# Altium footprint library 电解电容.PcbLib: 14 footprints
Each footprint in its own frame and in the unit in brackets; x right, y up, seen from the top. Pads: shape width x height; smd on the part's side, far side on the other; paste and mask are expansions set on the pad; w line width, h text height; cw(c..) or ccw(c..) is an arc to the next point about the centre after c.
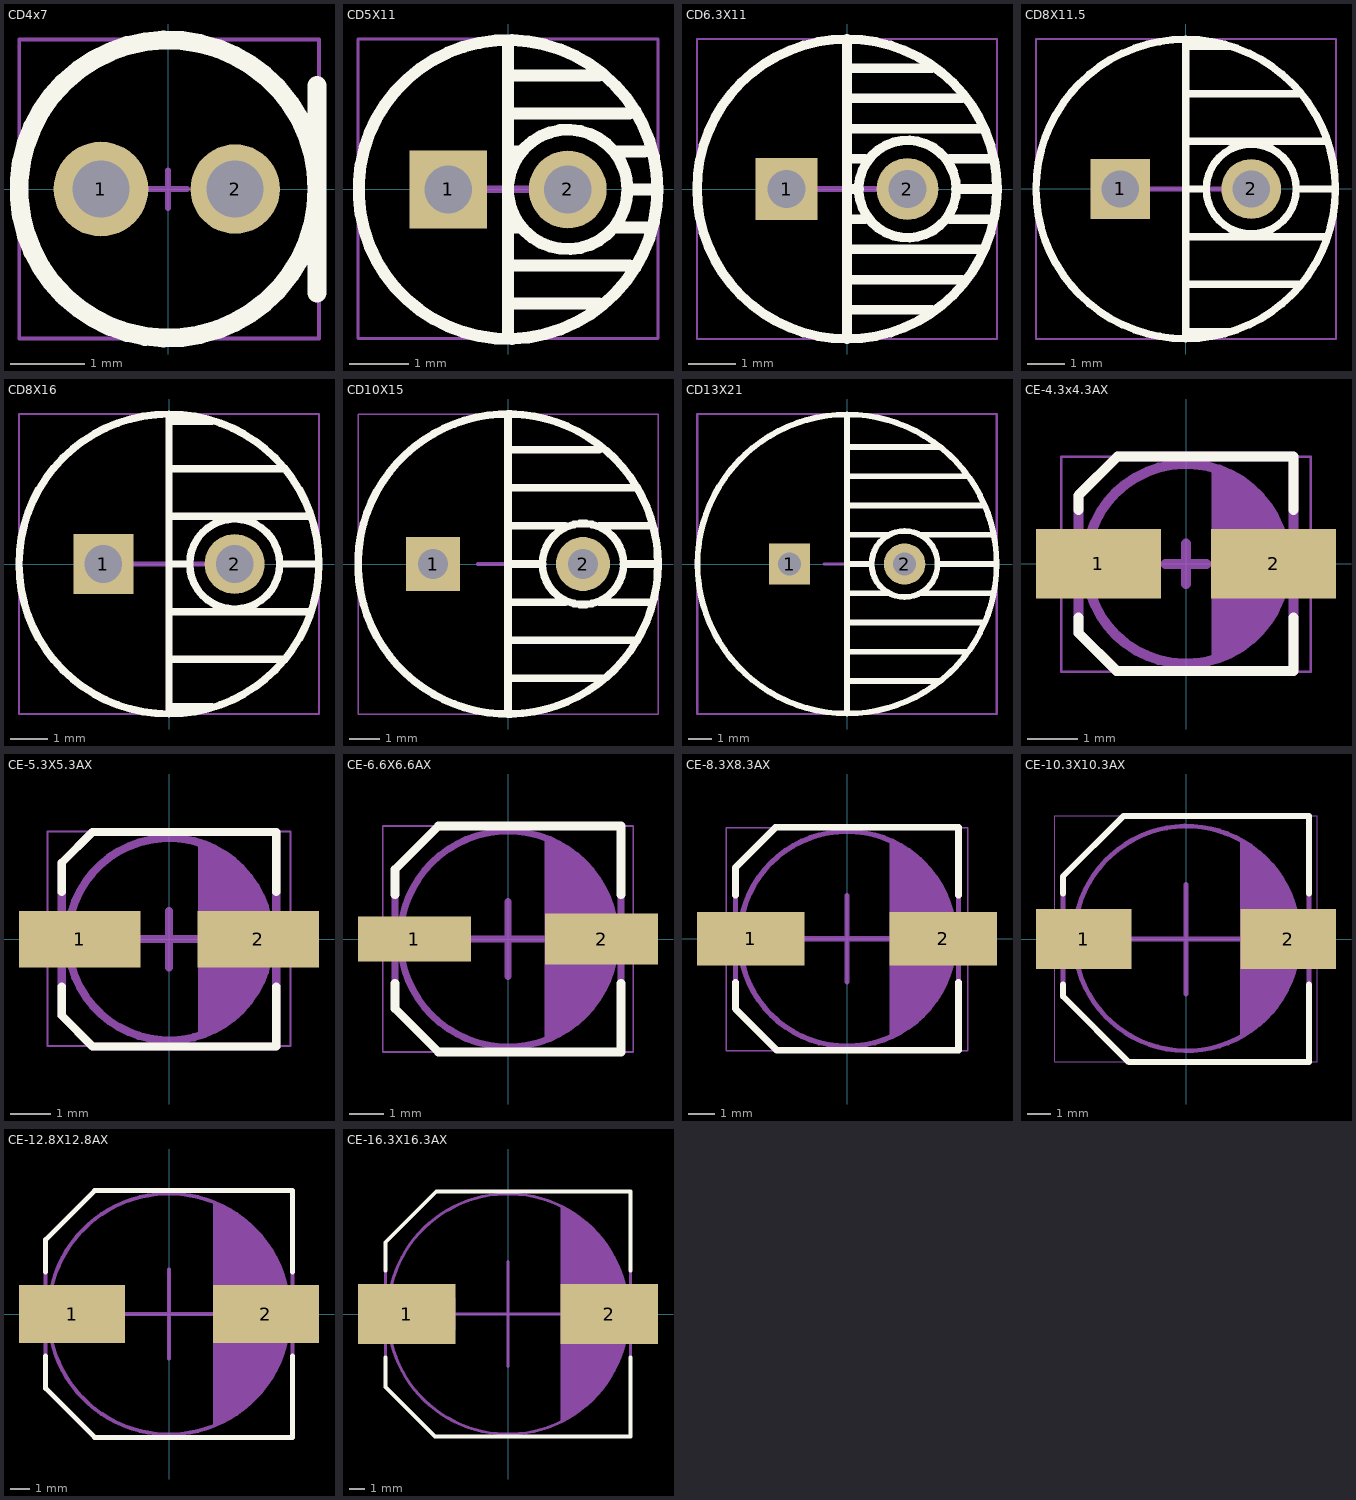
[diagram p0: the footprints below, top view; thin cyan lines are the x and y axes]

## CD4x7 [mm] "1uF/50V,10uF/25V"
height 7
pads (2):
  round 1.27 hole 0.762: 1(-0.9,0)
  round 1.2 hole 0.762: 2(0.9,0)
Top Overlay:
  circle w0.254: c0,0 r2
  lines w0.254: 2,-1.397 2,1.39
Mechanical 13:
  lines w0.05: -1.998,-2.007 -1.998,2.007 2.025,2.007 2.025,-2.007 -1.998,-2.007
Mechanical 15:
  lines w0.076: -0.254,0 0.254,0 ; 0,-0.254 0,0.254
3D body: height 7.11, standoff -3.6, extent -1.998,-2.007 2.025,2.007

## CD5X11 [mm] "CD11铝电解电容"
height 11
pads (2):
  rect 1.3x1.3 hole 0.8: 1(-1,0)
  round 1.3 hole 0.8: 2(1,0)
Top Overlay:
  circle w0.2: c1,0 r1
  circle w0.2: c0,0 r2.5
  lines w0.2: 0,-2.413 0,2.413 ; 0,-1.905 1.524,-1.905 ; 0,-1.27 2.032,-1.27 ; 0,-0.635 0.2,-0.635 ; 0,0.635 0.2,0.635 ; 0,1.27 2.032,1.27 ; 0,1.905 1.524,1.905 ; 1.778,-0.635 2.413,-0.635 ; 1.778,0.635 2.286,0.635 ; 2.032,0 2.5,0
Mechanical 13:
  lines w0.05: -2.51,-2.495 2.51,-2.495 2.51,2.515 -2.51,2.515 -2.51,-2.495
Mechanical 15:
  lines w0.127: -1,0 0,0 ; 0,-1 0,0 ; 0,1 0,0 ; 1,0 0,0
3D body: height 11.11, standoff -3.6, extent -2.51,-2.495 2.499,2.514

## CD6.3X11 [mm] "CD11铝电解电容"
height 11
pads (2):
  rect 1.3x1.3 hole 0.8: 1(-1.27,0)
  round 1.3 hole 0.8: 2(1.27,0)
Top Overlay:
  circle w0.2: c1.27,0 r1.024
  circle w0.2: c0,0 r3.15
  lines w0.2: 0,-3.048 0,3.048 ; 0,-2.54 1.778,-2.54 ; 0,-1.905 2.413,-1.905 ; 0,-1.27 2.794,-1.27 ; 0,-0.635 0.381,-0.635 ; 0,0 0.254,0 ; 0,0.635 0.381,0.635 ; 0,1.27 2.794,1.27 ; 0,1.905 2.413,1.905 ; 0,2.54 1.778,2.54 ; 2.159,-0.635 3.048,-0.635 ; 2.159,0.635 3.048,0.635 ; 2.286,0 3.15,0
Mechanical 13:
  lines w0.05: -3.15,-3.15 3.15,-3.15 3.15,3.15 -3.15,3.15 -3.15,-3.15
Mechanical 15:
  lines w0.127: -1,0 0,0 ; 0,-1 0,0 ; 0,1 0,0 ; 1,0 0,0
3D body: height 11.11, standoff -3.6, extent -3.15,-3.15 3.16,3.15

## CD8X11.5 [mm] "CD11铝电解电容"
height 11.5
pads (2):
  rect 1.6x1.6 hole 1: 1(-1.75,0)
  round 1.6 hole 1: 2(1.75,0)
Top Overlay:
  circle w0.2: c0,0 r4
  circle w0.2: c1.75,0 r1.2
  lines w0.2: 0,-4 0,4 ; 0,-3.81 1.143,-3.81 ; 0,-2.54 3.048,-2.54 ; 0,-1.27 3.683,-1.27 ; 0,0 0.508,0 ; 0,1.27 3.683,1.27 ; 0,2.54 3.048,2.54 ; 0,3.81 1.143,3.81 ; 2.95,0 4,0
Mechanical 13:
  lines w0.05: -3.997,-4.003 -3.997,4.002 4.013,4.002 4.013,-4.003 -3.997,-4.003
Mechanical 15:
  lines w0.127: -1,0 0,0 ; 0,-1 0,0 ; 0,1 0,0 ; 1,0 0,0
3D body: height 11.11, standoff -3.6, extent -3.997,-4.003 4.013,3.997

## CD8X16 [mm] "CD11铝电解电容"
height 16
pads (2):
  rect 1.6x1.6 hole 1: 1(-1.75,0)
  round 1.6 hole 1: 2(1.75,0)
Top Overlay:
  circle w0.2: c1.75,0 r1.2
  circle w0.2: c0,0 r4
  lines w0.2: 0,-4 0,4 ; 0,-3.81 1.143,-3.81 ; 0,-2.54 3.048,-2.54 ; 0,-1.27 3.683,-1.27 ; 0,0 0.508,0 ; 0,1.27 3.683,1.27 ; 0,2.54 3.048,2.54 ; 0,3.81 1.143,3.81 ; 2.95,0 4,0
Mechanical 13:
  lines w0.05: -4,-4 4,-4 4,4 -4,4 -4,-4
Mechanical 15:
  lines w0.127: -1,0 0,0 ; 0,-1 0,0 ; 0,1 0,0 ; 1,0 0,0
3D body: height 16, standoff -2.9, extent -4,-4 4,4

## CD10X15 [mm] "CD11铝电解电容"
height 15
pads (2):
  rect 1.8x1.8 hole 1: 1(-2.5,0)
  round 1.8 hole 1: 2(2.5,0)
Top Overlay:
  circle w0.254: c0,0 r5
  circle w0.254: c2.5,0 r1.352
  lines w0.254: 0,-5 0,5 ; 0,-3.81 3.175,-3.81 ; 0,-2.54 4.191,-2.54 ; 0,-1.27 1.905,-1.27 ; 0,0 1.143,0 ; 0,1.27 1.905,1.27 ; 0,2.54 4.191,2.54 ; 0,3.81 3.048,3.81 ; 3.048,-1.27 4.826,-1.27 ; 3.048,1.27 4.699,1.27 ; 3.852,0 5,0
Mechanical 13:
  lines w0.05: -5,-5 5,-5 5,5 -5,5 -5,-5
Mechanical 15:
  lines w0.127: -1,0 0,0 ; 0,-1 0,0 ; 0,1 0,0 ; 1,0 0,0
3D body: height 15.01, standoff -3.7, extent -5,-5.025 5.008,5.027

## CD13X21 [mm] "CD11铝电解电容"
height 21
pads (2):
  rect 1.8x1.8 hole 1: 1(-2.5,0)
  round 1.8 hole 1: 2(2.5,0)
Top Overlay:
  circle w0.254: c0,0 r6.5
  circle w0.254: c2.5,0 r1.435
  lines w0.254: 0,-6.5 0,6.5 ; 0,-5.08 3.962,-5.08 ; 0,-3.81 5.232,-3.81 ; 0,-2.54 5.918,-2.54 ; 0,-1.27 1.803,-1.27 ; 0,0 1.067,0 ; 0,1.27 1.803,1.27 ; 0,2.54 5.918,2.54 ; 0,3.81 5.232,3.81 ; 0,5.08 3.962,5.08 ; 3.175,-1.27 6.35,-1.27 ; 3.175,1.27 6.35,1.27 ; 3.935,0 6.5,0
Mechanical 13:
  lines w0.1: -6.508,-6.517 6.502,-6.517 6.502,6.517 -6.508,6.517 -6.508,-6.517
Mechanical 15:
  lines w0.127: -1,0 0,0 ; 0,-1 0,0 ; 0,1 0,0 ; 1,0 0,0
3D body: height 21.01, standoff -3.7, extent -6.508,-6.517 6.502,6.517

## CE-4.3x4.3AX [mm] "三洋固态电容"
height 6
pads (2):
  rect 2.5x1.4 smd: 1(-1.754,0) 2(1.754,0)
Top Overlay:
  lines w0.2: -2.15,-1.075 -2.15,-1.388 -1.388,-2.15 2.15,-2.15 2.15,-1.075 ; -2.15,1.075 -2.15,1.372 -1.372,2.15 2.15,2.15 2.15,1.075
Mechanical 2:
  rectangle: 0.508,-0.406 2.515,0.406
  rectangle: -2.515,-0.406 -0.508,0.406
Mechanical 13:
  lines w0.05: -2.5,-2.159 -2.5,2.141 2.5,2.141 2.5,-2.159 -2.5,-2.159
Mechanical 15:
  circle w0.2: c0,0 r2
  rectangle: 0.965,-1.651 1.118,1.651
  rectangle: 1.118,-1.575 1.27,1.6
  rectangle: 1.219,-1.422 1.448,1.499
  rectangle: 1.346,-1.295 1.549,1.346
  rectangle: 1.473,-1.143 1.676,1.219
  rectangle: 1.575,-0.965 1.803,0.94
  rectangle: 1.727,-0.686 1.905,0.686
  rectangle: 0.508,-1.854 0.965,1.829
  lines w0.2: -0.406,0 0.406,0 ; 0,-0.406 0,0.406 ; -2.15,-1.388 -2.15,1.372 -1.372,2.15 2.15,2.15 2.15,-2.15 -1.388,-2.15 -2.15,-1.388
3D body: height 5.55, standoff 0.05, extent -2.5,-2.159 2.5,2.141

## CE-5.3X5.3AX [mm] "三洋固态电容"
height 6
pads (2):
  rect 3x1.4 smd: 1(-2.206,0) 2(2.206,0)
Top Overlay:
  lines w0.2: -2.65,-1.168 -2.65,-1.888 -1.888,-2.65 2.65,-2.65 2.65,-1.168 ; -2.65,1.168 -2.65,1.888 -1.888,2.65 2.65,2.65 2.65,1.168
Mechanical 2:
  rectangle: 0.711,-0.406 2.997,0.406
  rectangle: -2.997,-0.406 -0.711,0.406
Mechanical 13:
  lines w0.05: -3,-2.642 3,-2.642 3,2.658 -3,2.658 -3,-2.642
Mechanical 15:
  circle w0.2: c0,0 r2.5
  rectangle: 1.829,-1.549 2.083,1.549
  rectangle: 1.676,-1.829 1.829,1.854
  rectangle: 2.057,-1.194 2.311,1.194
  rectangle: 2.311,-0.838 2.413,0.66
  rectangle: 0.711,-2.311 1.168,2.311
  rectangle: 1.168,-2.108 1.499,2.108
  rectangle: 1.499,-1.88 1.702,1.88
  lines w0.2: -0.7,0 0.7,0 ; 0,-0.7 0,0.7 ; -2.65,-1.888 -2.65,1.888 -1.888,2.65 2.65,2.65 2.65,-2.65 -1.888,-2.65 -2.65,-1.888
3D body: height 5.55, standoff 0.05, extent -3,-2.642 3,2.658

## CE-6.6X6.6AX [mm] "三洋固态电容"
height 6
pads (2):
  rect 3.3x1.3 smd: 1(-2.731,0)
  rect 3.3x1.5 smd: 2(2.731,0)
Top Overlay:
  lines w0.254: -3.3,-1.3 -3.3,-2.03 -2.03,-3.3 3.3,-3.3 3.3,-1.3 ; -3.3,1.3 -3.3,2.03 -2.03,3.3 3.3,3.3 3.3,1.3
Mechanical 2:
  rectangle: -3.65,-0.4 -1.1,0.4
  rectangle: 1.1,-0.4 3.65,0.4
Mechanical 13:
  lines w0.05: -3.658,-3.302 -3.658,3.302 3.658,3.302 3.658,-3.302 -3.658,-3.302
Mechanical 15:
  circle w0.2: c0,0 r3.15
  rectangle: 1.854,-2.438 2.083,2.438
  rectangle: 1.499,-2.667 1.854,2.667
  rectangle: 1.067,-2.87 1.499,2.87
  rectangle: 2.946,-0.864 3.073,0.813
  rectangle: 2.769,-1.295 2.946,1.372
  rectangle: 2.54,-1.702 2.769,1.702
  rectangle: 2.311,-2.007 2.54,2.007
  rectangle: 2.057,-2.261 2.311,2.261
  lines w0.2: -1.1,0 1.1,0 ; 0,-1.1 0,1.1 ; -3.3,-2.03 -3.3,2.03 -2.03,3.3 3.3,3.3 3.3,-3.3 -2.03,-3.3 -3.3,-2.03
3D body: height 6, standoff 0, extent -3.65,-3.298 3.65,3.302

## CE-8.3X8.3AX [mm] "三洋固态电容"
height 10.2
pads (2):
  rect 4x2 smd: 1(-3.583,0) 2(3.583,0)
Top Overlay:
  lines w0.254: -4.15,-1.621 -4.15,-2.606 -2.606,-4.15 4.15,-4.15 4.15,-1.621 ; -4.15,1.621 -4.15,2.657 -2.657,4.15 4.15,4.15 4.15,1.621
Mechanical 2:
  rectangle: 1.6,-0.5 4.5,0.5
  rectangle: -4.5,-0.5 -1.6,0.5
Mechanical 13:
  lines w0.05: -4.5,-4.166 -4.5,4.134 4.5,4.134 4.5,-4.166 -4.5,-4.166
Mechanical 15:
  circle w0.2: c0,0 r4
  rectangle: 3.886,-0.584 3.912,0.381
  rectangle: 3.683,-1.295 3.886,1.295
  rectangle: 3.48,-1.778 3.683,1.778
  rectangle: 3.277,-2.159 3.48,2.134
  rectangle: 3.023,-2.464 3.277,2.464
  rectangle: 2.769,-2.769 3.023,2.769
  rectangle: 2.438,-3.023 2.769,3.048
  rectangle: 1.575,-3.581 1.981,3.581
  rectangle: 1.981,-3.378 2.311,3.378
  rectangle: 2.311,-3.15 2.515,3.15
  lines w0.2: -1.6,0 1.6,0 ; 0,-1.6 0,1.6 ; -4.15,-2.606 -2.606,-4.15 4.15,-4.15 4.15,4.15 -2.657,4.15 -4.15,2.657 -4.15,-2.606
3D body: height 9.8, standoff 0, extent -4.5,-4.166 4.5,4.134

## CE-10.3X10.3AX [mm] "三洋固态电容"
height 7.7
pads (2):
  rect 4x2.5 smd: 1(-4.281,0) 2(4.281,0)
Top Overlay:
  lines w0.254: -5.15,-1.9 -5.15,-2.394 -2.394,-5.15 5.15,-5.15 5.15,-1.9 ; -5.15,1.9 -5.15,2.622 -2.622,5.15 5.15,5.15 5.15,1.9
Mechanical 2:
  rectangle: -5.5,-0.7 -2.3,0.7
  rectangle: 2.3,-0.7 5.5,0.7
Mechanical 13:
  lines w0.05: -5.5,-5.144 -5.5,5.156 5.5,5.156 5.5,-5.144 -5.5,-5.144
Mechanical 15:
  circle w0.2: c0.025,0.025 r4.706
  rectangle: 3.962,-2.388 4.166,2.438
  rectangle: 4.166,-2.007 4.369,2.057
  rectangle: 4.369,-1.524 4.572,1.575
  rectangle: 4.572,-0.737 4.648,0.787
  rectangle: 3.734,-2.718 3.962,2.769
  rectangle: 3.48,-3.023 3.734,3.073
  rectangle: 3.226,-3.302 3.48,3.353
  rectangle: 2.946,-3.556 3.226,3.607
  rectangle: 2.616,-3.785 2.946,3.835
  rectangle: 2.261,-4.013 2.616,4.064
  lines w0.2: -2.3,0 2.3,0 ; 0,-2.3 0,2.3 ; -5.15,-2.394 -5.15,2.622 -2.622,5.15 5.15,5.15 5.15,-5.15 -2.394,-5.15 -5.15,-2.394
3D body: height 7.71, standoff 0, extent -5.5,-5.144 5.5,5.156

## CE-12.8X12.8AX [mm] "三洋固态电容"
height 13.5
pads (2):
  rect 5.5x3 smd: 1(-5.033,0) 2(5.033,0)
Top Overlay:
  lines w0.254: -6.4,-2.185 -6.4,-3.862 -3.862,-6.4 6.4,-6.4 6.4,-2.185 ; -6.4,2.185 -6.4,3.862 -3.862,6.4 6.4,6.4 6.4,2.185
Mechanical 2:
  rectangle: 2.3,-0.7 6.75,0.7
  rectangle: -6.75,-0.7 -2.3,0.7
Mechanical 15:
  circle w0.2: c0,0 r6.25
  rectangle: 2.286,-5.74 2.692,5.74
  rectangle: 2.692,-5.537 3.099,5.537
  rectangle: 3.099,-5.334 3.429,5.334
  rectangle: 3.429,-5.131 3.734,5.131
  rectangle: 3.734,-4.902 4.013,4.902
  rectangle: 4.013,-4.674 4.293,4.674
  rectangle: 4.293,-4.42 4.547,4.42
  rectangle: 4.547,-4.166 4.775,4.166
  rectangle: 4.775,-3.886 5.004,3.886
  rectangle: 5.004,-3.581 5.232,3.581
  rectangle: 5.232,-3.251 5.436,3.251
  rectangle: 5.436,-2.896 5.639,2.896
  rectangle: 5.639,-2.464 5.842,2.464
  rectangle: 5.842,-1.93 6.045,1.93
  rectangle: 6.045,-1.143 6.172,1.168
  lines w0.2: -2.3,0 2.3,0 ; 0,-2.3 0,2.3 ; -6.4,-3.862 -6.4,3.862 -3.862,6.4 6.4,6.4 6.4,-6.4 -3.862,-6.4 -6.4,-3.862

## CE-16.3X16.3AX [mm] "三洋固态电容"
height 16.5
pads (2):
  rect 6.5x4 smd: 1(-6.735,0) 2(6.735,0)
Top Overlay:
  lines w0.254: -8.15,-2.896 -8.15,-4.855 -4.855,-8.15 8.15,-8.15 8.15,-2.896 ; -8.15,2.896 -8.15,4.779 -4.779,8.15 8.15,8.15 8.15,2.896
Mechanical 2:
  rectangle: -8.65,-1.05 -3.5,1.05
  rectangle: 3.5,-1.05 8.65,1.05
Mechanical 15:
  circle w0.2: c0,0 r8
  rectangle: 3.48,-7.112 3.861,7.112
  rectangle: 3.861,-6.909 4.216,6.909
  rectangle: 4.216,-6.706 4.521,6.706
  rectangle: 4.521,-6.502 4.826,6.502
  rectangle: 4.826,-6.274 5.105,6.274
  rectangle: 5.105,-6.045 5.385,6.045
  rectangle: 5.385,-5.791 5.639,5.791
  rectangle: 5.639,-5.537 5.893,5.537
  rectangle: 5.893,-5.283 6.121,5.283
  rectangle: 6.121,-5.004 6.35,5.004
  rectangle: 6.35,-4.724 6.579,4.724
  rectangle: 6.579,-4.394 6.782,4.394
  rectangle: 6.782,-4.064 6.985,4.064
  rectangle: 6.985,-3.708 7.188,3.708
  rectangle: 7.188,-3.302 7.391,3.302
  rectangle: 7.391,-2.794 7.595,2.794
  rectangle: 7.595,-2.184 7.798,2.184
  rectangle: 7.798,-1.295 7.925,1.295
  lines w0.2: -3.5,0 3.5,0 ; 0,-3.5 0,3.5 ; -8.15,-4.855 -8.15,4.779 -4.779,8.15 8.15,8.15 8.15,-8.15 -4.855,-8.15 -8.15,-4.855